# Altium footprint library ICs And Semiconductors THD.PcbLib: 507 footprints (part 3 of 32)
Each footprint in its own frame and in the unit in brackets; x right, y up, seen from the top. Pads: shape width x height; smd on the part's side, far side on the other; paste and mask are expansions set on the pad; w line width, h text height; cw(c..) or ccw(c..) is an arc to the next point about the centre after c.
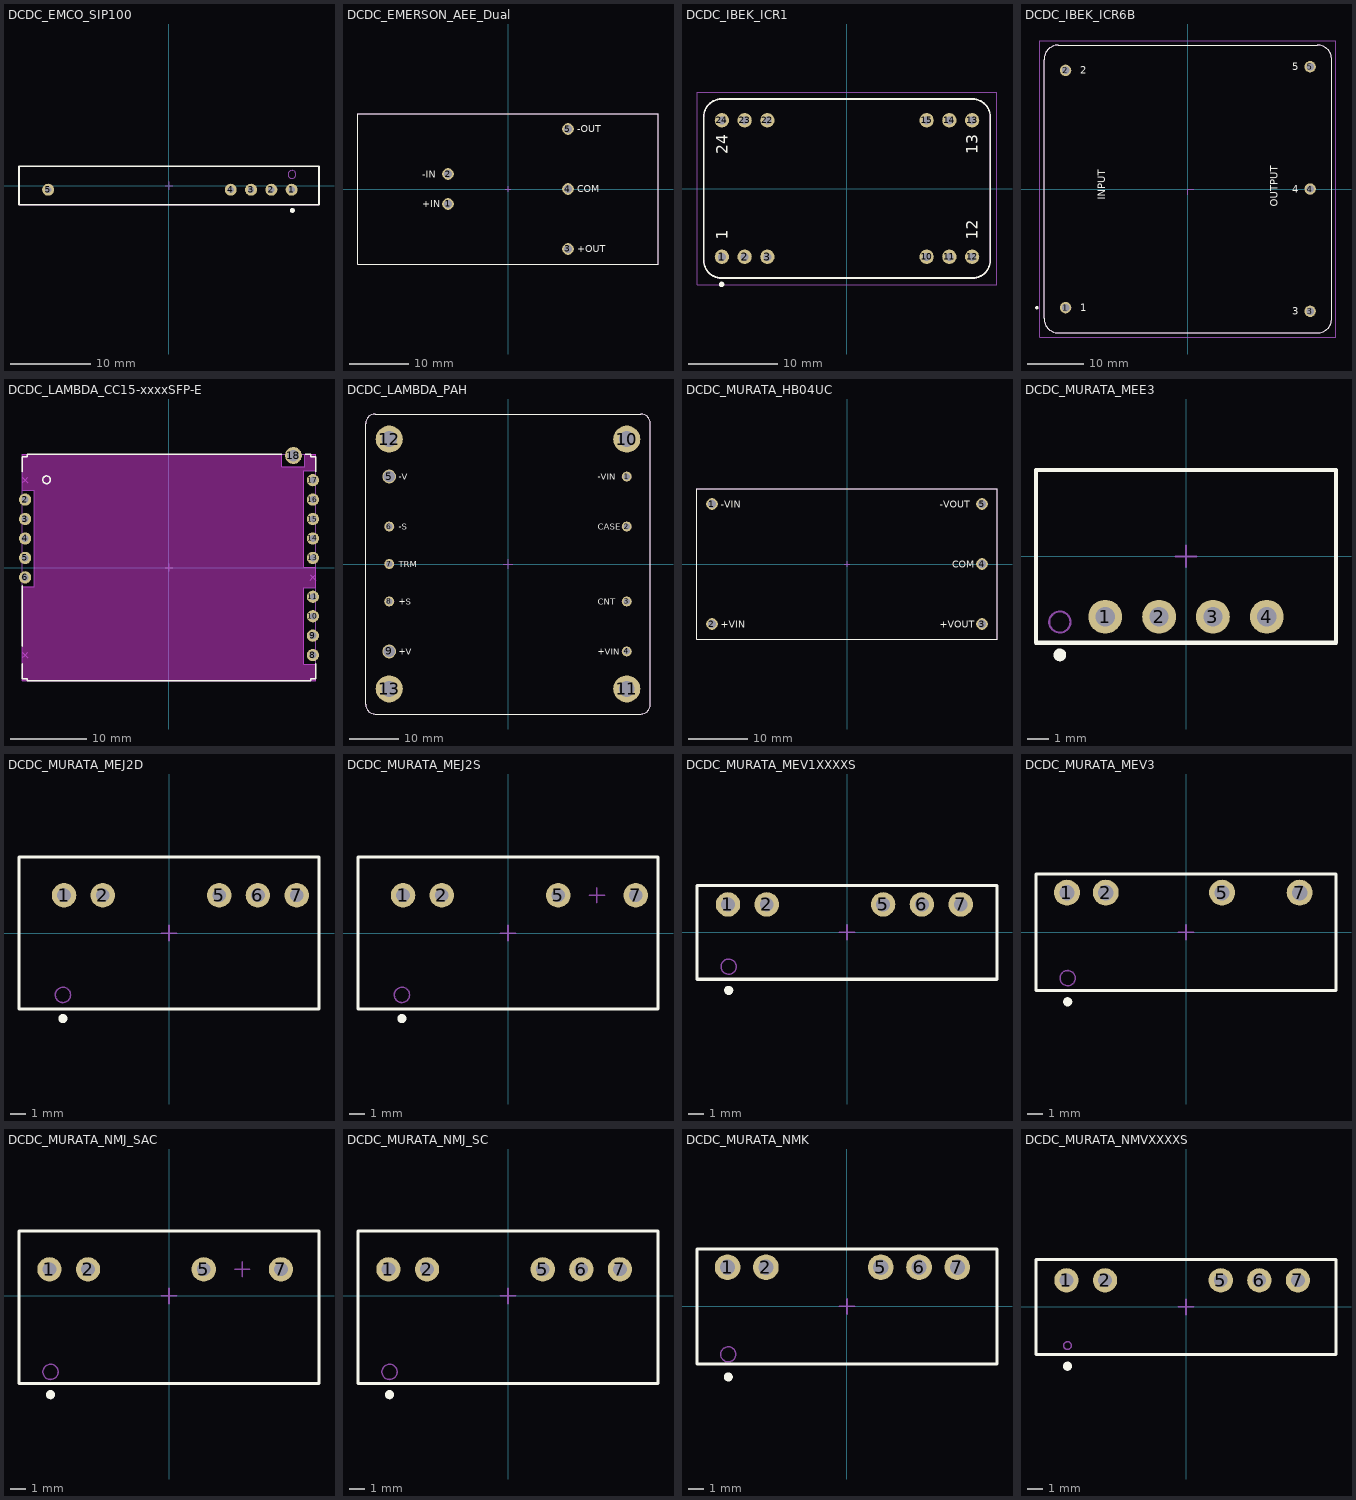
[diagram p2: the footprints below, top view; thin cyan lines are the x and y axes]

## DCDC_EMCO_SIP100 [mm] "SIP Series Model 100 , Body 36.8 x 4.06mm, Regulated, Low Profile High Voltage DC-DC Converter"
height 19.81
pads (5):
  round 1.5 hole 0.8: 1(15.35,-0.51) 2(12.81,-0.51) 3(10.27,-0.51) 4(7.73,-0.51) 5(-15.13,-0.51)
Top Overlay:
  circle w0.3: c15.45,-3.1 r0.15
  lines w0.2: -18.78,-2.41 18.78,-2.41 18.78,2.41 -18.78,2.41 -18.78,-2.41
Notvisible:
  lines w0.1: -15.63,-0.51 -15.13,-0.51 ; -15.13,-1.01 -15.13,-0.51 ; -15.13,-0.01 -15.13,-0.51 ; -14.63,-0.51 -15.13,-0.51 ; -0.5,0 0,0 ; 0,-0.5 0,0 ; 0,0.5 0,0 ; 0.5,0 0,0 ; 7.23,-0.51 7.73,-0.51 ; 7.73,-1.01 7.73,-0.51 ; 7.73,-0.01 7.73,-0.51 ; 8.23,-0.51 7.73,-0.51 ; 9.77,-0.51 10.27,-0.51 ; 10.27,-1.01 10.27,-0.51 ; 10.27,-0.01 10.27,-0.51 ; 10.77,-0.51 10.27,-0.51 ; 12.31,-0.51 12.81,-0.51 ; 12.81,-1.01 12.81,-0.51 ; 12.81,-0.01 12.81,-0.51 ; 13.31,-0.51 12.81,-0.51 ; 14.85,-0.51 15.35,-0.51 ; 15.35,-1.01 15.35,-0.51 ; 15.35,-0.01 15.35,-0.51 ; 15.85,-0.51 15.35,-0.51
Mechanical 14:
  circle w0.1: c15.4,1.4 r0.5
  lines w0.1: -18.78,-2.41 18.78,-2.41 18.78,2.41 -18.78,2.41 -18.78,-2.41
3D body "DCDC_EMCO_SIP100.stp": height 19.81, standoff -3.6, extent -18.78,-2.41 18.78,2.41

## DCDC_EMERSON_AEE_Dual [mm] "AEE 15W Series , Dual Output DCDC Converter, Body 50.8x25.4mm, Height 11.3mm"
height 11.3
pads (5):
  round 2 hole 1.3: 1(-10.16,-2.54) 2(-10.16,2.54) 3(10.16,-10.16) 4(10.16,0) 5(10.16,10.16)
Top Overlay:
  lines w0.2: -25.4,-12.7 -25.4,12.7 25.4,12.7 25.4,-12.7 -25.4,-12.7
  text "-IN" at -14.55,1.9 h1.2
  text "-OUT" at 11.71,9.645 h1.2
  text "+OUT" at 11.71,-10.675 h1.2
  text "+IN" at -14.55,-3.1 h1.2
  text "COM" at 11.71,-0.515 h1.2
Notvisible:
  lines w0.1: -10.66,-2.54 -10.16,-2.54 ; -10.66,2.54 -10.16,2.54 ; -10.16,-3.04 -10.16,-2.54 ; -10.16,-2.04 -10.16,-2.54 ; -10.16,2.04 -10.16,2.54 ; -10.16,3.04 -10.16,2.54 ; -9.66,-2.54 -10.16,-2.54 ; -9.66,2.54 -10.16,2.54 ; -0.5,0 0,0 ; 0,-0.5 0,0 ; 0,0.5 0,0 ; 0.5,0 0,0 ; 9.66,-10.16 10.16,-10.16 ; 9.66,0 10.16,0 ; 9.66,10.16 10.16,10.16 ; 10.16,-10.66 10.16,-10.16 ; 10.16,-9.66 10.16,-10.16 ; 10.16,-0.5 10.16,0 ; 10.16,0.5 10.16,0 ; 10.16,9.66 10.16,10.16 ; 10.16,10.66 10.16,10.16 ; 10.66,-10.16 10.16,-10.16 ; 10.66,0 10.16,0 ; 10.66,10.16 10.16,10.16
Mechanical 14:
  lines w0.1: -25.4,-12.7 -25.4,12.7 25.4,12.7 25.4,-12.7 -25.4,-12.7
  text "+OUT" at 11.71,-10.675 h1.2
  text "-OUT" at 11.71,9.645 h1.2
  text "+IN" at -14.55,-3.1 h1.2
  text "-IN" at -14.55,1.9 h1.2
  text "COM" at 11.71,-0.515 h1.2
3D body "DCDC_EMERSON_AEE_Dual.stp": height 11.3, standoff -3.8, extent -25.4,-12.7 25.4,12.7

## DCDC_IBEK_ICR1 [mm] "ICR1 Series , Body 32x20mm, Pitch 2.54mm"
height 10.5
pads (12):
  round 1.6 hole 0.9: 1(-13.97,-7.62) 2(-11.43,-7.62) 3(-8.89,-7.62) 10(8.89,-7.62) 11(11.43,-7.62) 12(13.97,-7.62) 13(13.97,7.62) 14(11.43,7.62) 15(8.89,7.62) 22(-8.89,7.62) 23(-11.43,7.62) 24(-13.97,7.62)
Top Overlay:
  circle w0.3: c-14,-10.7 r0.15
  lines w0.2: -16,-8 ccw(c-14,-8) -14,-10 14,-10 ccw(c14,-8) 16,-8 16,8 ccw(c14,8) 14,10 -14,10 ccw(c-14,8) -16,8 -16,-8
  text "1" at -13.335,-5.715 h1.27
  text "13" at 14.605,3.81 h1.27
  text "24" at -13.335,3.81 h1.27
  text "12" at 14.605,-5.715 h1.27
Mechanical 14:
  lines w0.1: -16,-8 ccw(c-14,-8) -14,-10 14,-10 ccw(c14,-8) 16,-8 16,8 ccw(c14,8) 14,10 -14,10 ccw(c-14,8) -16,8 -16,-8
  text "1" at -13.335,-5.715 h1.27
  text "12" at 14.605,-5.715 h1.27
  text "13" at 14.605,3.81 h1.27
  text "24" at -13.335,3.81 h1.27
Mechanical 15:
  lines w0.05: -16.75,-10.75 16.75,-10.75 16.75,10.75 -16.75,10.75 -16.75,-10.75
3D body "DCDC_IBEK_ICR1.stp": height 10.5, standoff -3, extent -16,-10 16,10

## DCDC_IBEK_ICR6B [mm] "ICR6 Series , Body 50.8x50.8mm"
height 10.5
pads (5):
  round 2 hole 1.3: 1(-21.59,-20.955) 2(-21.59,20.955) 3(21.59,-21.59) 4(21.59,0) 5(21.59,21.59)
Top Overlay:
  circle w0.3: c-26.67,-20.955 r0.15
  lines w0.2: -25.4,-22.86 ccw(c-22.86,-22.86) -22.86,-25.4 22.86,-25.4 ccw(c22.86,-22.86) 25.4,-22.86 25.4,22.86 ccw(c22.86,22.86) 22.86,25.4 -22.86,25.4 ccw(c-22.86,22.86) -25.4,22.86 -25.4,-22.86
  text "3" at 18.415,-22.225 h1.27
  text "4" at 18.415,-0.635 h1.27
  text "5" at 18.415,20.955 h1.27
  text "2" at -19.05,20.32 h1.27
  text "1" at -19.05,-21.59 h1.27
  text "INPUT" at -14.605,-1.905 h1.27
  text "OUTPUT" at 15.875,-3.175 h1.27
Notvisible:
  circle w0.1: c-21.59,-20.955 r0.5
  circle w0.1: c21.59,-21.59 r0.5
  circle w0.1: c21.59,0 r0.5
  circle w0.1: c21.59,21.59 r0.5
  circle w0.1: c-21.59,20.955 r0.5
  lines w0.2: -21.59,-21.955 -21.59,-20.955 -20.59,-20.955 ; -21.59,19.955 -21.59,20.955 -20.59,20.955 ; 0,-1 0,0 1,0 ; 21.59,-22.59 21.59,-21.59 22.59,-21.59 ; 21.59,-1 21.59,0 22.59,0 ; 21.59,20.59 21.59,21.59 22.59,21.59
Mechanical 14:
  lines w0.1: -25.4,-22.86 ccw(c-22.86,-22.86) -22.86,-25.4 22.86,-25.4 ccw(c22.86,-22.86) 25.4,-22.86 25.4,22.86 ccw(c22.86,22.86) 22.86,25.4 -22.86,25.4 ccw(c-22.86,22.86) -25.4,22.86 -25.4,-22.86
  text "3" at 18.415,-22.225 h1.27
  text "4" at 18.415,-0.635 h1.27
  text "5" at 18.415,20.955 h1.27
  text "2" at -19.05,20.32 h1.27
  text "1" at -19.05,-21.59 h1.27
  text "INPUT" at -14.605,-1.905 h1.27
  text "OUTPUT" at 15.875,-3.175 h1.27
Mechanical 15:
  lines w0.05: -26.15,-26.15 -26.15,26.15 26.15,26.15 26.15,-26.15 -26.15,-26.15
3D body "DCDC_IBEK_ICR6B.stp": height 10.5, standoff -3, extent -25.4,-25.4 25.4,25.4

## DCDC_LAMBDA_CC15-xxxxSFP-E [mm] "CCP-E Series, Body L 38.4mm x W 29.6mm x H 6.8mm"
height 6.8
pads (15):
  round 1.6 hole 0.9: 2(-18.8,8.89) 3(-18.8,6.35) 4(-18.8,3.81) 5(-18.8,1.27) 6(-18.8,-1.27) 8(18.8,-11.43) 9(18.8,-8.89) 10(18.8,-6.35) 11(18.8,-3.81) 13(18.8,1.27) 14(18.8,3.81) 15(18.8,6.35) 16(18.8,8.89) 17(18.8,11.43)
  round 2.2 hole 1.5: 18(16.26,14.65)
Top Layer keep-out:
  region: -19.2,-2.47 -17.6,-2.47 -17.6,10.09 -19.2,10.09 -19.2,14.8 14.76,14.8 14.76,13.15 17.76,13.15 17.76,14.8 19.2,14.8 19.2,12.63 17.6,12.63 17.6,0.07 19.2,0.07 19.2,-2.61 17.6,-2.61 17.6,-12.63 19.2,-12.63 19.2,-14.8 -19.2,-14.8
Top Overlay:
  circle w0.2: c-16,11.48 r0.5
  lines w0.2: -19.2,-12.561 -19.2,-14.5 -18.5,-14.5 -18.5,-14.8 18.5,-14.8 18.5,-14.5 19.2,-14.5 19.2,-12.561 ; -19.2,-10.299 -19.2,-2.401 ; -19.2,12.561 -19.2,14.5 -18.5,14.5 -18.5,14.8 14.732,14.8 ; 17.78,14.8 18.5,14.8 18.5,14.5 19.2,14.5 19.2,12.561
Notvisible:
  lines w0.1: -19.3,-1.27 -18.8,-1.27 ; -19.3,1.27 -18.8,1.27 ; -19.3,3.81 -18.8,3.81 ; -19.3,6.35 -18.8,6.35 ; -19.3,8.89 -18.8,8.89 ; -19.154,-11.784 -18.8,-11.43 ; -19.154,-11.076 -18.8,-11.43 ; -19.154,11.076 -18.8,11.43 ; -19.154,11.784 -18.8,11.43 ; -18.8,-1.77 -18.8,-1.27 ; -18.8,-0.77 -18.8,-1.27 ; -18.8,0.77 -18.8,1.27 ; -18.8,1.77 -18.8,1.27 ; -18.8,3.31 -18.8,3.81 ; -18.8,4.31 -18.8,3.81 ; -18.8,5.85 -18.8,6.35 ; -18.8,6.85 -18.8,6.35 ; -18.8,8.39 -18.8,8.89 ; -18.8,9.39 -18.8,8.89 ; -18.446,-11.784 -18.8,-11.43 ; -18.446,-11.076 -18.8,-11.43 ; -18.446,11.076 -18.8,11.43 ; -18.446,11.784 -18.8,11.43 ; -18.3,-1.27 -18.8,-1.27 ; -18.3,1.27 -18.8,1.27 ; -18.3,3.81 -18.8,3.81 ; -18.3,6.35 -18.8,6.35 ; -18.3,8.89 -18.8,8.89 ; -0.5,0 0,0 ; 0,-0.5 0,0 ; 0,0.5 0,0 ; 0.5,0 0,0 ; 15.76,14.65 16.26,14.65 ; 16.26,14.15 16.26,14.65 ; 16.26,15.15 16.26,14.65 ; 16.76,14.65 16.26,14.65 ; 18.3,-11.43 18.8,-11.43 ; 18.3,-8.89 18.8,-8.89 ; 18.3,-6.35 18.8,-6.35 ; 18.3,-3.81 18.8,-3.81 ; 18.3,1.27 18.8,1.27 ; 18.3,3.81 18.8,3.81 ; 18.3,6.35 18.8,6.35 ; 18.3,8.89 18.8,8.89 ; 18.3,11.43 18.8,11.43 ; 18.446,-1.624 18.8,-1.27 ; 18.446,-0.916 18.8,-1.27 ; 18.8,-11.93 18.8,-11.43 ; 18.8,-10.93 18.8,-11.43 ; 18.8,-9.39 18.8,-8.89 ; 18.8,-8.39 18.8,-8.89 ; 18.8,-6.85 18.8,-6.35 ; 18.8,-5.85 18.8,-6.35 ; 18.8,-4.31 18.8,-3.81 ; 18.8,-3.31 18.8,-3.81 ; 18.8,0.77 18.8,1.27 ; 18.8,1.77 18.8,1.27 ; 18.8,3.31 18.8,3.81 ; 18.8,4.31 18.8,3.81 ; 18.8,5.85 18.8,6.35 ; 18.8,6.85 18.8,6.35 ; 18.8,8.39 18.8,8.89 ; 18.8,9.39 18.8,8.89 ; 18.8,10.93 18.8,11.43 ; 18.8,11.93 18.8,11.43 ; 19.154,-1.624 18.8,-1.27 ; 19.154,-0.916 18.8,-1.27 ; 19.3,-11.43 18.8,-11.43 ; 19.3,-8.89 18.8,-8.89 ; 19.3,-6.35 18.8,-6.35 ; 19.3,-3.81 18.8,-3.81 ; 19.3,1.27 18.8,1.27 ; 19.3,3.81 18.8,3.81 ; 19.3,6.35 18.8,6.35 ; 19.3,8.89 18.8,8.89 ; 19.3,11.43 18.8,11.43 ; -19.2,-14.8 19.2,-14.8 19.2,-12.63 17.6,-12.63 17.6,-2.61 19.2,-2.61 19.2,0.07 17.6,0.07 17.6,12.63 19.2,12.63 19.2,14.8 17.76,14.8 17.76,13.15 14.76,13.15 14.76,14.8 -19.2,14.8 -19.2,10.09 -17.6,10.09 -17.6,-2.47 -19.2,-2.47 -19.2,-14.8
Mechanical 14:
  circle w0.1: c-16,11.48 r0.5
  lines w0.1: -19.2,-14.5 -19.2,14.5 -18.5,14.5 -18.5,14.8 18.5,14.8 18.5,14.5 19.2,14.5 19.2,-14.5 18.5,-14.5 18.5,-14.8 -18.5,-14.8 -18.5,-14.5 -19.2,-14.5
3D body "DC-DC_LAMBDA_CC15-xxxxSFP-E.stp": height 6.3, standoff -2.5, extent -19.2,-14.8 19.2,14.8

## DCDC_LAMBDA_PAH [mm] "PAH Series , Body 57.9x61mm"
height 12.95
pads (13):
  round 2 hole 1.3: 1(24.15,17.78) 2(24.15,7.62) 3(24.15,-7.62) 4(24.15,-17.78) 6(-24.15,7.62) 7(-24.15,0) 8(-24.15,-7.62)
  round 2.8 hole 2.3: 5(-24.15,17.78) 9(-24.15,-17.78)
  round 5.5 hole 3.2: 10(24.15,25.4) 11(24.15,-25.4) 12(-24.15,25.4) 13(-24.15,-25.4)
Top Overlay:
  lines w0.2: -28.95,-28.5 ccw(c-26.95,-28.5) -26.95,-30.5 26.95,-30.5 ccw(c26.95,-28.5) 28.95,-28.5 28.95,28.5 ccw(c26.95,28.5) 26.95,30.5 -26.95,30.5 ccw(c-26.95,28.5) -28.95,28.5 -28.95,-28.5
  text "TRM" at -22.175,-0.695 h1.27
  text "-VIN" at 18.265,17.125 h1.27
  text "-S" at -22.175,6.925 h1.27
  text "+S" at -22.175,-8.315 h1.27
  text "+V" at -22.175,-18.475 h1.27
  text "-V" at -22.175,17.085 h1.27
  text "CASE" at 18.265,6.965 h1.27
  text "CNT" at 18.265,-8.275 h1.27
  text "+VIN" at 18.265,-18.435 h1.27
Notvisible:
  lines w0.1: -25.15,-25.4 -24.15,-25.4 ; -25.15,-17.78 -24.15,-17.78 ; -25.15,-7.62 -24.15,-7.62 ; -25.15,0 -24.15,0 ; -25.15,7.62 -24.15,7.62 ; -25.15,17.78 -24.15,17.78 ; -25.15,25.4 -24.15,25.4 ; -24.15,-26.4 -24.15,-25.4 ; -24.15,-24.4 -24.15,-25.4 ; -24.15,-18.78 -24.15,-17.78 ; -24.15,-16.78 -24.15,-17.78 ; -24.15,-8.62 -24.15,-7.62 ; -24.15,-6.62 -24.15,-7.62 ; -24.15,-1 -24.15,0 ; -24.15,1 -24.15,0 ; -24.15,6.62 -24.15,7.62 ; -24.15,8.62 -24.15,7.62 ; -24.15,16.78 -24.15,17.78 ; -24.15,18.78 -24.15,17.78 ; -24.15,24.4 -24.15,25.4 ; -24.15,26.4 -24.15,25.4 ; -23.15,-25.4 -24.15,-25.4 ; -23.15,-17.78 -24.15,-17.78 ; -23.15,-7.62 -24.15,-7.62 ; -23.15,0 -24.15,0 ; -23.15,7.62 -24.15,7.62 ; -23.15,17.78 -24.15,17.78 ; -23.15,25.4 -24.15,25.4 ; -1,0 0,0 ; 0,-1 0,0 ; 0,1 0,0 ; 1,0 0,0 ; 23.15,-25.4 24.15,-25.4 ; 23.15,-17.78 24.15,-17.78 ; 23.15,-7.62 24.15,-7.62 ; 23.15,7.62 24.15,7.62 ; 23.15,17.78 24.15,17.78 ; 23.15,25.4 24.15,25.4 ; 24.15,-26.4 24.15,-25.4 ; 24.15,-24.4 24.15,-25.4 ; 24.15,-18.78 24.15,-17.78 ; 24.15,-16.78 24.15,-17.78 ; 24.15,-8.62 24.15,-7.62 ; 24.15,-6.62 24.15,-7.62 ; 24.15,6.62 24.15,7.62 ; 24.15,8.62 24.15,7.62 ; 24.15,16.78 24.15,17.78 ; 24.15,18.78 24.15,17.78 ; 24.15,24.4 24.15,25.4 ; 24.15,26.4 24.15,25.4 ; 25.15,-25.4 24.15,-25.4 ; 25.15,-17.78 24.15,-17.78 ; 25.15,-7.62 24.15,-7.62 ; 25.15,7.62 24.15,7.62 ; 25.15,17.78 24.15,17.78 ; 25.15,25.4 24.15,25.4
Mechanical 14:
  lines w0.1: -28.95,-28.5 ccw(c-26.95,-28.5) -26.95,-30.5 26.95,-30.5 ccw(c26.95,-28.5) 28.95,-28.5 28.95,28.5 ccw(c26.95,28.5) 26.95,30.5 -26.95,30.5 ccw(c-26.95,28.5) -28.95,28.5 -28.95,-28.5
  text "TRM" at -22.175,-0.695 h1.27
  text "-VIN" at 18.265,17.125 h1.27
  text "-S" at -22.175,6.925 h1.27
  text "+S" at -22.175,-8.315 h1.27
  text "+V" at -22.175,-18.475 h1.27
  text "-V" at -22.175,17.085 h1.27
  text "CASE" at 18.265,6.965 h1.27
  text "CNT" at 18.265,-8.275 h1.27
  text "+VIN" at 18.265,-18.435 h1.27
3D body "DC-DC_LAMBDA_PAH.stp": height 12.95, standoff -3.8, extent -28.95,-30.5 28.95,30.5

## DCDC_MURATA_HB04UC [mm] "HB04UC Series , Body 50.8x25.4mm, Height 10.4mm"
height 10.41
pads (5):
  round 2 hole 1.3: 1(-22.86,10.16) 2(-22.86,-10.16) 3(22.86,-10.16) 4(22.86,0) 5(22.86,10.16)
Top Overlay:
  lines w0.2: -25.4,-12.7 25.4,-12.7 25.4,12.7 -25.4,12.7 -25.4,-12.7
  text "+VIN" at -21.385,-10.765 h1.2
  text "+VOUT" at 15.725,-10.815 h1.2
  text "-VIN" at -21.385,9.555 h1.2
  text "COM" at 17.825,-0.605 h1.2
  text "-VOUT" at 15.725,9.505 h1.2
Notvisible:
  lines w0.1: -23.36,-10.16 -22.86,-10.16 ; -23.36,10.16 -22.86,10.16 ; -22.86,-10.66 -22.86,-10.16 ; -22.86,-9.66 -22.86,-10.16 ; -22.86,9.66 -22.86,10.16 ; -22.86,10.66 -22.86,10.16 ; -22.36,-10.16 -22.86,-10.16 ; -22.36,10.16 -22.86,10.16 ; -0.5,0 0,0 ; 0,-0.5 0,0 ; 0,0.5 0,0 ; 0.5,0 0,0 ; 22.36,-10.16 22.86,-10.16 ; 22.36,0 22.86,0 ; 22.36,10.16 22.86,10.16 ; 22.86,-10.66 22.86,-10.16 ; 22.86,-9.66 22.86,-10.16 ; 22.86,-0.5 22.86,0 ; 22.86,0.5 22.86,0 ; 22.86,9.66 22.86,10.16 ; 22.86,10.66 22.86,10.16 ; 23.36,-10.16 22.86,-10.16 ; 23.36,0 22.86,0 ; 23.36,10.16 22.86,10.16
Mechanical 14:
  lines w0.1: -25.4,-12.7 25.4,-12.7 25.4,12.7 -25.4,12.7 -25.4,-12.7
  text "+VIN" at -21.385,-10.765 h1.2
  text "+VOUT" at 15.725,-10.815 h1.2
  text "-VIN" at -21.385,9.555 h1.2
  text "COM" at 17.825,-0.605 h1.2
  text "-VOUT" at 15.725,9.505 h1.2
3D body "DCDC_MURATA_HB04UC.stp": height 10.46, standoff -3.8, extent -25.4,-12.7 25.4,12.7

## DCDC_MURATA_MEE3 [mm] "MEE3 Series , Body 14.15 x 8.15mm, SIP Package"
height 10.15
pads (4):
  round 1.6 hole 0.9: 1(-3.81,-2.85) 2(-1.27,-2.85) 3(1.27,-2.85) 4(3.81,-2.85)
Top Overlay:
  circle w0.3: c-5.95,-4.65 r0.15
  lines w0.2: -7.075,-4.075 7.075,-4.075 7.075,4.075 -7.075,4.075 -7.075,-4.075
Notvisible:
  lines w0.1: -4.31,-2.85 -3.81,-2.85 ; -3.81,-3.35 -3.81,-2.85 ; -3.81,-2.35 -3.81,-2.85 ; -3.31,-2.85 -3.81,-2.85 ; -1.77,-2.85 -1.27,-2.85 ; -1.27,-3.35 -1.27,-2.85 ; -1.27,-2.35 -1.27,-2.85 ; -0.77,-2.85 -1.27,-2.85 ; -0.5,0 0,0 ; 0,-0.5 0,0 ; 0,0.5 0,0 ; 0.5,0 0,0 ; 0.77,-2.85 1.27,-2.85 ; 1.27,-3.35 1.27,-2.85 ; 1.27,-2.35 1.27,-2.85 ; 1.77,-2.85 1.27,-2.85 ; 3.31,-2.85 3.81,-2.85 ; 3.81,-3.35 3.81,-2.85 ; 3.81,-2.35 3.81,-2.85 ; 4.31,-2.85 3.81,-2.85
Mechanical 14:
  circle w0.1: c-5.95,-3.1 r0.5
  lines w0.1: -7.075,-4.075 7.075,-4.075 7.075,4.075 -7.075,4.075 -7.075,-4.075
3D body "DCDC_MURATA_MEE3.stp": height 10.25, standoff -3.2, extent -7.075,-4.075 7.075,4.075

## DCDC_MURATA_MEJ2D [mm] "MEJ2 Series , Body 19.65 x 9.95mm, SIP-7"
height 12.65
pads (5):
  round 1.6 hole 0.9: 1(-6.875,2.475) 2(-4.335,2.475) 5(3.285,2.475) 6(5.825,2.475) 7(8.365,2.475)
Top Overlay:
  circle w0.3: c-6.95,-5.6 r0.15
  lines w0.2: -9.825,-4.975 -9.825,4.975 9.825,4.975 9.825,-4.975 -9.825,-4.975
Notvisible:
  lines w0.1: -7.375,2.475 -6.875,2.475 ; -6.875,1.975 -6.875,2.475 ; -6.875,2.975 -6.875,2.475 ; -6.375,2.475 -6.875,2.475 ; -4.835,2.475 -4.335,2.475 ; -4.335,1.975 -4.335,2.475 ; -4.335,2.975 -4.335,2.475 ; -3.835,2.475 -4.335,2.475 ; -0.5,0 0,0 ; 0,-0.5 0,0 ; 0,0.5 0,0 ; 0.5,0 0,0 ; 2.785,2.475 3.285,2.475 ; 3.285,1.975 3.285,2.475 ; 3.285,2.975 3.285,2.475 ; 3.785,2.475 3.285,2.475 ; 5.325,2.475 5.825,2.475 ; 5.825,1.975 5.825,2.475 ; 5.825,2.975 5.825,2.475 ; 6.325,2.475 5.825,2.475 ; 7.865,2.475 8.365,2.475 ; 8.365,1.975 8.365,2.475 ; 8.365,2.975 8.365,2.475 ; 8.865,2.475 8.365,2.475
Mechanical 14:
  circle w0.1: c-6.95,-4.05 r0.5
  lines w0.1: -9.825,-4.975 -9.825,4.975 9.825,4.975 9.825,-4.975 -9.825,-4.975
3D body "DCDC_MURATA_MEJ2D.stp": height 12.65, standoff -3.6, extent -9.825,-4.975 9.825,4.975

## DCDC_MURATA_MEJ2S [mm] "MEJ2 Series , Body 19.65 x 9.95mm, SIP-7"
height 9.95
pads (4):
  round 1.6 hole 0.9: 1(-6.875,2.475) 2(-4.335,2.475) 5(3.285,2.475) 7(8.365,2.475)
Top Overlay:
  circle w0.3: c-6.95,-5.6 r0.15
  lines w0.2: -9.825,-4.975 -9.825,4.975 9.825,4.975 9.825,-4.975 -9.825,-4.975
Notvisible:
  lines w0.1: -7.375,2.475 -6.875,2.475 ; -6.875,1.975 -6.875,2.475 ; -6.875,2.975 -6.875,2.475 ; -6.375,2.475 -6.875,2.475 ; -4.835,2.475 -4.335,2.475 ; -4.335,1.975 -4.335,2.475 ; -4.335,2.975 -4.335,2.475 ; -3.835,2.475 -4.335,2.475 ; -0.5,0 0,0 ; 0,-0.5 0,0 ; 0,0.5 0,0 ; 0.5,0 0,0 ; 2.785,2.475 3.285,2.475 ; 3.285,1.975 3.285,2.475 ; 3.285,2.975 3.285,2.475 ; 3.785,2.475 3.285,2.475 ; 5.325,2.475 5.825,2.475 ; 5.825,1.975 5.825,2.475 ; 5.825,2.975 5.825,2.475 ; 6.325,2.475 5.825,2.475 ; 7.865,2.475 8.365,2.475 ; 8.365,1.975 8.365,2.475 ; 8.365,2.975 8.365,2.475 ; 8.865,2.475 8.365,2.475
Mechanical 14:
  circle w0.1: c-6.95,-4.05 r0.5
  lines w0.1: -9.825,-4.975 -9.825,4.975 9.825,4.975 9.825,-4.975 -9.825,-4.975
3D body "DCDC_MURATA_MEJ2S.stp": height 12.65, standoff -3.6, extent -9.825,-4.975 9.825,4.975

## DCDC_MURATA_MEV1XXXXS [mm] "MEV1 Series , Body 19.65 x 6.15mm, SIP-7"
height 10.15
pads (5):
  round 1.6 hole 0.9: 1(-7.795,1.825) 2(-5.255,1.825) 5(2.365,1.825) 6(4.905,1.825) 7(7.445,1.825)
Top Overlay:
  circle w0.3: c-7.75,-3.8 r0.15
  lines w0.2: -9.825,-3.075 -9.825,3.075 9.825,3.075 9.825,-3.075 -9.825,-3.075
Notvisible:
  lines w0.1: -8.295,1.825 -7.795,1.825 ; -7.795,1.325 -7.795,1.825 ; -7.795,2.325 -7.795,1.825 ; -7.295,1.825 -7.795,1.825 ; -5.755,1.825 -5.255,1.825 ; -5.255,1.325 -5.255,1.825 ; -5.255,2.325 -5.255,1.825 ; -4.755,1.825 -5.255,1.825 ; -0.5,0 0,0 ; 0,-0.5 0,0 ; 0,0.5 0,0 ; 0.5,0 0,0 ; 1.865,1.825 2.365,1.825 ; 2.365,1.325 2.365,1.825 ; 2.365,2.325 2.365,1.825 ; 2.865,1.825 2.365,1.825 ; 4.405,1.825 4.905,1.825 ; 4.905,1.325 4.905,1.825 ; 4.905,2.325 4.905,1.825 ; 5.405,1.825 4.905,1.825 ; 6.945,1.825 7.445,1.825 ; 7.445,1.325 7.445,1.825 ; 7.445,2.325 7.445,1.825 ; 7.945,1.825 7.445,1.825
Mechanical 14:
  circle w0.1: c-7.75,-2.25 r0.5
  lines w0.1: -9.825,-3.075 -9.825,3.075 9.825,3.075 9.825,-3.075 -9.825,-3.075
3D body "DCDC_MURATA_MEV1XXXXS.stp": height 10.15, standoff -3.6, extent -9.825,-3.075 9.825,3.075

## DCDC_MURATA_MEV3 [mm] "MEV3S Series , Body 19.65 x 7.65mm, SIP-7"
height 10.15
pads (4):
  round 1.7 hole 1: 1(-7.795,2.6) 2(-5.255,2.6) 5(2.365,2.6) 7(7.445,2.6)
Top Overlay:
  circle w0.3: c-7.75,-4.55 r0.15
  lines w0.2: -9.825,-3.825 -9.825,3.825 9.825,3.825 9.825,-3.825 -9.825,-3.825
Notvisible:
  lines w0.1: -8.295,2.6 -7.795,2.6 ; -7.795,2.1 -7.795,2.6 ; -7.795,3.1 -7.795,2.6 ; -7.295,2.6 -7.795,2.6 ; -5.755,2.6 -5.255,2.6 ; -5.255,2.1 -5.255,2.6 ; -5.255,3.1 -5.255,2.6 ; -4.755,2.6 -5.255,2.6 ; -0.5,0 0,0 ; 0,-0.5 0,0 ; 0,0.5 0,0 ; 0.5,0 0,0 ; 1.865,2.6 2.365,2.6 ; 2.365,2.1 2.365,2.6 ; 2.365,3.1 2.365,2.6 ; 2.865,2.6 2.365,2.6 ; 6.945,2.6 7.445,2.6 ; 7.445,2.1 7.445,2.6 ; 7.445,3.1 7.445,2.6 ; 7.945,2.6 7.445,2.6
Mechanical 14:
  circle w0.1: c-7.75,-3 r0.5
  lines w0.1: -9.825,-3.825 -9.825,3.825 9.825,3.825 9.825,-3.825 -9.825,-3.825
3D body "DCDC_MURATA_MEV3.stp": height 10.15, standoff -3.6, extent -9.825,-3.825 9.825,3.825

## DCDC_MURATA_NMJ_SAC [mm] "NMJ Series, Single Output, Body 19.5 x 9.8mm, SIP-7"
height 12.5
pads (4):
  round 1.6 hole 0.9: 1(-7.87,1.75) 2(-5.33,1.75) 5(2.29,1.75) 7(7.37,1.75)
Top Overlay:
  circle w0.3: c-7.8,-6.5 r0.15
  lines w0.2: -9.875,-5.775 -9.875,4.275 9.875,4.275 9.875,-5.775 -9.875,-5.775
Notvisible:
  lines w0.1: -8.37,1.75 -7.87,1.75 ; -7.87,1.25 -7.87,1.75 ; -7.87,2.25 -7.87,1.75 ; -7.37,1.75 -7.87,1.75 ; -5.83,1.75 -5.33,1.75 ; -5.33,1.25 -5.33,1.75 ; -5.33,2.25 -5.33,1.75 ; -4.83,1.75 -5.33,1.75 ; -0.5,0 0,0 ; 0,-0.5 0,0 ; 0,0.5 0,0 ; 0.5,0 0,0 ; 1.79,1.75 2.29,1.75 ; 2.29,1.25 2.29,1.75 ; 2.29,2.25 2.29,1.75 ; 2.79,1.75 2.29,1.75 ; 4.33,1.75 4.83,1.75 ; 4.83,1.25 4.83,1.75 ; 4.83,2.25 4.83,1.75 ; 5.33,1.75 4.83,1.75 ; 6.87,1.75 7.37,1.75 ; 7.37,1.25 7.37,1.75 ; 7.37,2.25 7.37,1.75 ; 7.87,1.75 7.37,1.75
Mechanical 14:
  circle w0.1: c-7.8,-5 r0.5
  lines w0.1: -9.875,-5.775 -9.875,4.275 9.875,4.275 9.875,-5.775 -9.875,-5.775
3D body "DCDC_MURATA_NMJ_SAC.stp": height 12.75, standoff -3.75, extent -9.875,-5.775 9.875,4.275

## DCDC_MURATA_NMJ_SC [mm] "NMJ Series, Dual Output, Body 19.5 x 9.8mm, SIP-7"
height 12.5
pads (5):
  round 1.6 hole 0.9: 1(-7.87,1.75) 2(-5.33,1.75) 5(2.29,1.75) 6(4.83,1.75) 7(7.37,1.75)
Top Overlay:
  circle w0.3: c-7.8,-6.5 r0.15
  lines w0.2: -9.875,-5.775 -9.875,4.275 9.875,4.275 9.875,-5.775 -9.875,-5.775
Notvisible:
  lines w0.1: -8.37,1.75 -7.87,1.75 ; -7.87,1.25 -7.87,1.75 ; -7.87,2.25 -7.87,1.75 ; -7.37,1.75 -7.87,1.75 ; -5.83,1.75 -5.33,1.75 ; -5.33,1.25 -5.33,1.75 ; -5.33,2.25 -5.33,1.75 ; -4.83,1.75 -5.33,1.75 ; -0.5,0 0,0 ; 0,-0.5 0,0 ; 0,0.5 0,0 ; 0.5,0 0,0 ; 1.79,1.75 2.29,1.75 ; 2.29,1.25 2.29,1.75 ; 2.29,2.25 2.29,1.75 ; 2.79,1.75 2.29,1.75 ; 4.33,1.75 4.83,1.75 ; 4.83,1.25 4.83,1.75 ; 4.83,2.25 4.83,1.75 ; 5.33,1.75 4.83,1.75 ; 6.87,1.75 7.37,1.75 ; 7.37,1.25 7.37,1.75 ; 7.37,2.25 7.37,1.75 ; 7.87,1.75 7.37,1.75
Mechanical 14:
  circle w0.1: c-7.8,-5 r0.5
  lines w0.1: -9.875,-5.775 -9.875,4.275 9.875,4.275 9.875,-5.775 -9.875,-5.775
3D body "DCDC_MURATA_NMJ_SC.stp": height 12.75, standoff -3.75, extent -9.875,-5.775 9.875,4.275

## DCDC_MURATA_NMK [mm] "NMK Series , Body 19.65 x 7.65mm, SIP-7"
height 10.15
pads (5):
  round 1.7 hole 1: 1(-7.92,2.6) 2(-5.38,2.6) 5(2.24,2.6) 6(4.78,2.6) 7(7.32,2.6)
Top Overlay:
  circle w0.3: c-7.875,-4.675 r0.15
  lines w0.2: -9.95,-3.825 -9.95,3.825 9.95,3.825 9.95,-3.825 -9.95,-3.825
Notvisible:
  lines w0.1: -8.42,2.6 -7.92,2.6 ; -7.92,2.1 -7.92,2.6 ; -7.92,3.1 -7.92,2.6 ; -7.42,2.6 -7.92,2.6 ; -5.88,2.6 -5.38,2.6 ; -5.38,2.1 -5.38,2.6 ; -5.38,3.1 -5.38,2.6 ; -4.88,2.6 -5.38,2.6 ; -0.5,0 0,0 ; 0,-0.5 0,0 ; 0,0.5 0,0 ; 0.5,0 0,0 ; 1.74,2.6 2.24,2.6 ; 2.24,2.1 2.24,2.6 ; 2.24,3.1 2.24,2.6 ; 2.74,2.6 2.24,2.6 ; 4.28,2.6 4.78,2.6 ; 4.78,2.1 4.78,2.6 ; 4.78,3.1 4.78,2.6 ; 5.28,2.6 4.78,2.6 ; 6.82,2.6 7.32,2.6 ; 7.32,2.1 7.32,2.6 ; 7.32,3.1 7.32,2.6 ; 7.82,2.6 7.32,2.6
Mechanical 14:
  circle w0.1: c-7.875,-3.175 r0.5
  lines w0.1: -9.95,-3.825 -9.95,3.825 9.95,3.825 9.95,-3.825 -9.95,-3.825
3D body "DCDC_MURATA_NMK.stp": height 10.15, standoff -3.6, extent -9.95,-3.825 9.95,3.825

## DCDC_MURATA_NMVXXXXS [mm] "NMV Series , Body 19.5 x 6mm, SIP-7"
height 10.25
pads (5):
  round 1.6 hole 0.9: 1(-7.87,1.75) 2(-5.33,1.75) 5(2.29,1.75) 6(4.83,1.75) 7(7.37,1.75)
Top Overlay:
  circle w0.3: c-7.8,-3.9 r0.15
  lines w0.2: -9.875,-3.125 -9.875,3.125 9.875,3.125 9.875,-3.125 -9.875,-3.125
Notvisible:
  lines w0.1: -8.37,1.75 -7.87,1.75 ; -7.87,1.25 -7.87,1.75 ; -7.87,2.25 -7.87,1.75 ; -7.37,1.75 -7.87,1.75 ; -5.83,1.75 -5.33,1.75 ; -5.33,1.25 -5.33,1.75 ; -5.33,2.25 -5.33,1.75 ; -4.83,1.75 -5.33,1.75 ; -0.5,0 0,0 ; 0,-0.5 0,0 ; 0,0.5 0,0 ; 0.5,0 0,0 ; 1.79,1.75 2.29,1.75 ; 2.29,1.25 2.29,1.75 ; 2.29,2.25 2.29,1.75 ; 2.79,1.75 2.29,1.75 ; 4.33,1.75 4.83,1.75 ; 4.83,1.25 4.83,1.75 ; 4.83,2.25 4.83,1.75 ; 5.33,1.75 4.83,1.75 ; 6.87,1.75 7.37,1.75 ; 7.37,1.25 7.37,1.75 ; 7.37,2.25 7.37,1.75 ; 7.87,1.75 7.37,1.75
Mechanical 14:
  circle w0.1: c-7.8,-2.54 r0.254
  lines w0.1: -9.875,-3.125 9.875,-3.125 9.875,3.125 -9.875,3.125 -9.875,-3.125
3D body "DCDC_MURATA_NMVXXXXS.stp": height 10.25, standoff -3.75, extent -9.875,-3.125 9.875,3.125